# Altium footprint library Pcb-hionyPcbLib.PcbLib: 580 footprints (part 36 of 37)
Each footprint in its own frame and in the unit in brackets; x right, y up, seen from the top. Pads: shape width x height; smd on the part's side, far side on the other; paste and mask are expansions set on the pad; w line width, h text height; cw(c..) or ccw(c..) is an arc to the next point about the centre after c.
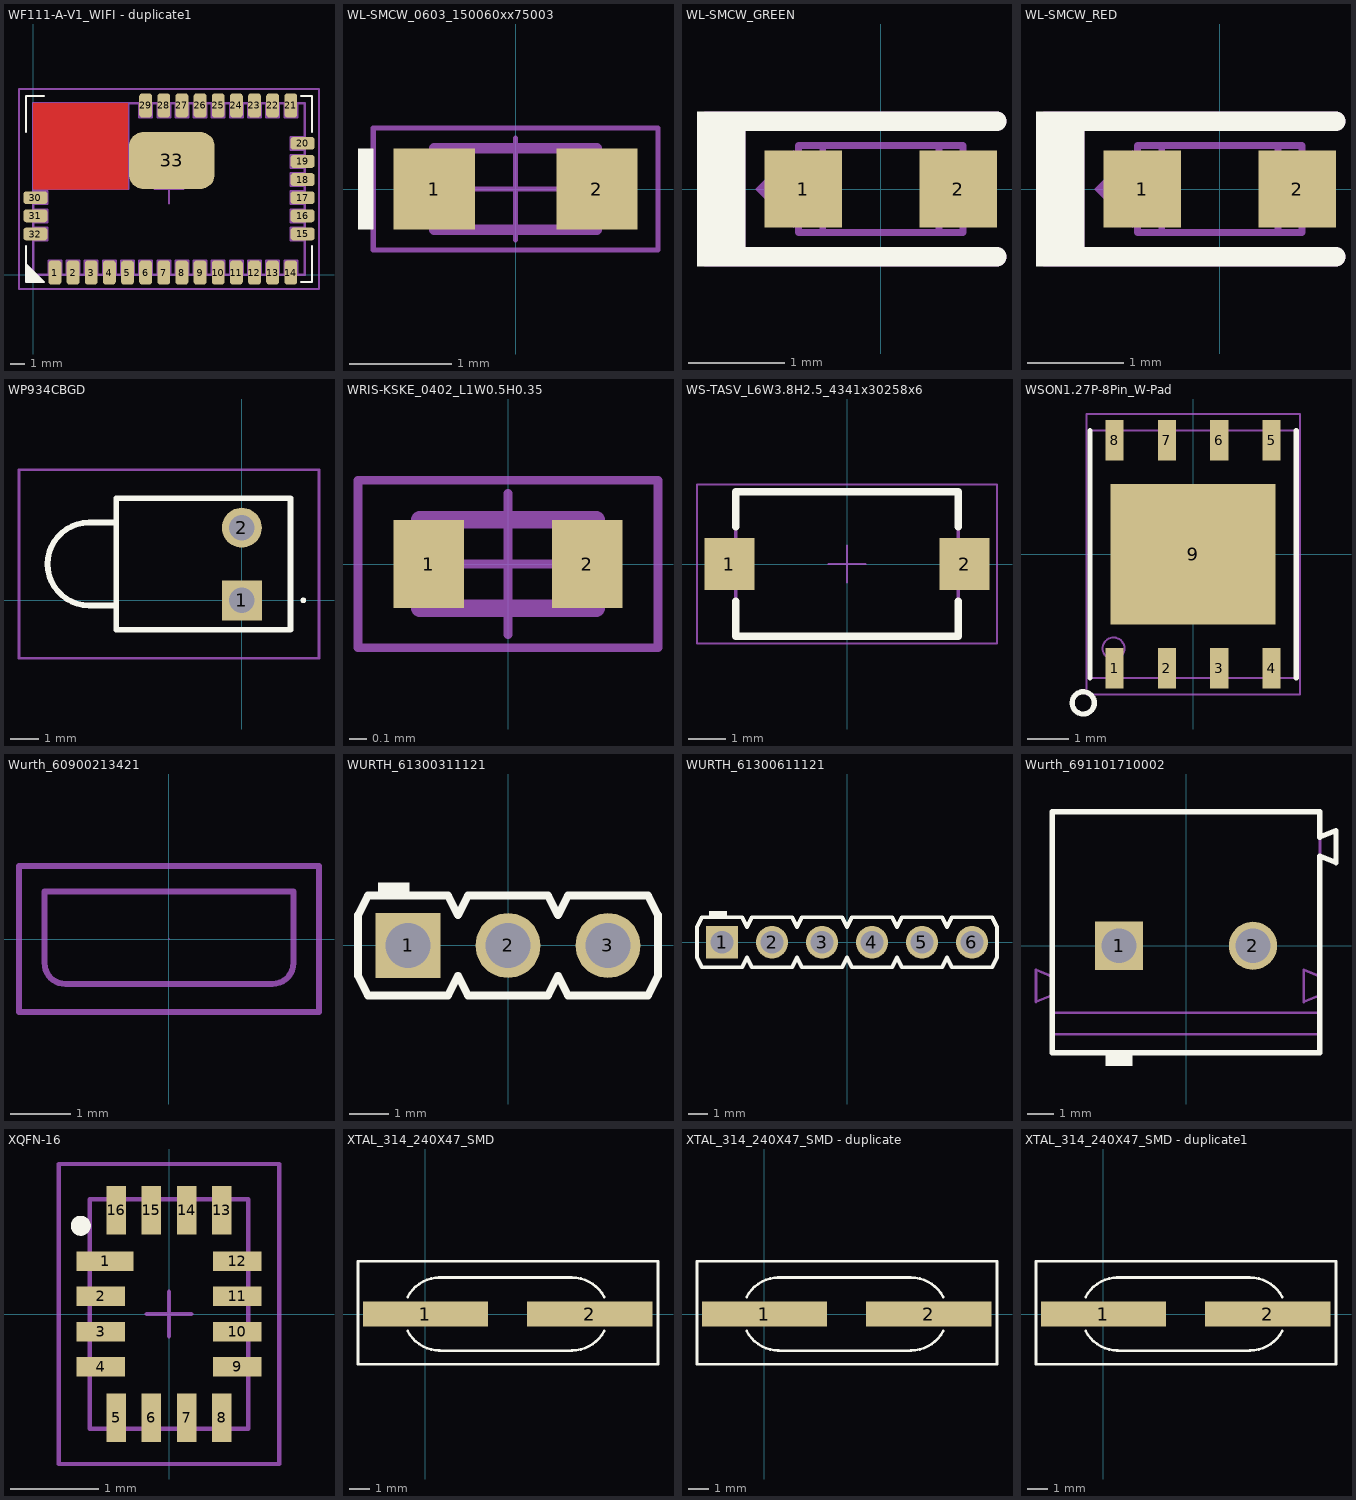
[diagram p35: the footprints below, top view; thin cyan lines are the x and y axes]

## WF111-A-V1_WIFI - duplicate1 [mm]
pads (33):
  rrect50% 0.9x1.7 smd mask+0.05: 1(1.515,0.15) 2(2.785,0.15) 3(4.055,0.15) 4(5.325,0.15) 5(6.595,0.15) 6(7.865,0.15) 7(9.135,0.15) 8(10.405,0.15) 9(11.675,0.15) 10(12.945,0.15) 11(14.215,0.15) 12(15.485,0.15) 13(16.755,0.15) 14(18.025,0.15) 21(18.025,11.85) 22(16.755,11.85) 23(15.485,11.85) 24(14.215,11.85) 25(12.945,11.85) 26(11.675,11.85) 27(10.405,11.85) 28(9.135,11.85) 29(7.865,11.85)
  rrect50% 1.7x0.9 smd mask+0.05: 15(18.85,2.85) 16(18.85,4.12) 17(18.85,5.39) 18(18.85,6.66) 19(18.85,7.93) 20(18.85,9.2) 30(0.15,5.39) 31(0.15,4.12) 32(0.15,2.85)
  rrect50% 6x4 smd mask+0.05: 33(9.7,8)
Top Layer:
  pour cut-out: 0,6 0,12 6.6,12 6.6,6
Top Overlay:
  region: 0.8,-0.5 -0.5,0.8 -0.5,-0.5
  lines w0.15: -0.5,2 -0.5,-0.5 0.75,-0.5 ; -0.5,10 -0.5,12.5 0.75,12.5 ; 18.75,-0.5 19.5,-0.5 19.5,2 ; 18.75,12.5 19.5,12.5 19.5,10
Mechanical 13:
  lines w0.15: 0,6 6.665,6 ; 0,6.6 5.4,12 ; 0,7.9 4.1,12 ; 0,9.2 2.8,12 ; 0,10.5 1.5,12 ; 0.7,6 6.7,12 ; 2,6 6.65,10.65 ; 3.3,6 6.65,9.35 ; 4.6,6 6.65,8.05 ; 5.9,6 6.633,6.732 ; 6.665,6.085 6.665,12 ; 0,0 19,0 19,12 0,12 0,0 ; 0,2.4 1,2.4 1,3.3 0,3.3 0,2.4 ; 0,3.67 0,4.57 1,4.57 1,3.67 0,3.67 ; 0,4.94 0,5.84 1,5.84 1,4.94 0,4.94 ; 1.065,0 1.065,1 1.965,1 1.965,0 1.065,0 ; 2.335,0 2.335,1 3.235,1 3.235,0 2.335,0 ; 3.605,0 4.505,0 4.505,1 3.605,1 3.605,0 ; 4.875,0 5.775,0 5.775,1 4.875,1 4.875,0 ; 6.145,0 7.045,0 7.045,1 6.145,1 6.145,0 ; 7.415,0 8.315,0 8.315,1 7.415,1 7.415,0 ; 7.415,11 7.415,12 8.315,12 8.315,11 7.415,11 ; 8.685,0 9.585,0 9.585,1 8.685,1 8.685,0 ; 8.685,11 8.685,12 9.585,12 9.585,11 8.685,11 ; 9.955,0 10.855,0 10.855,1 9.955,1 9.955,0 ; 9.955,11 9.955,12 10.855,12 10.855,11 9.955,11 ; 11.225,0 11.225,1 12.125,1 12.125,0 11.225,0 ; 11.225,11 12.125,11 12.125,12 11.225,12 11.225,11 ; 12.495,0 12.495,1 13.395,1 13.395,0 12.495,0 ; 12.495,11 13.395,11 13.395,12 12.495,12 12.495,11 ; 13.765,0 13.765,1 14.665,1 14.665,0 13.765,0 ; 13.765,11 14.665,11 14.665,12 13.765,12 13.765,11 ; 15.035,0 15.035,1 15.935,1 15.935,0 15.035,0 ; 15.035,11 15.935,11 15.935,12 15.035,12 15.035,11 ; 16.305,0 16.305,1 17.205,1 17.205,0 16.305,0 ; 16.305,11 17.205,11 17.205,12 16.305,12 16.305,11 ; 17.575,0 18.475,0 18.475,1 17.575,1 17.575,0 ; 17.575,11 17.575,12 18.475,12 18.475,11 17.575,11 ; 18,2.4 19,2.4 19,3.3 18,3.3 18,2.4 ; 18,3.67 18,4.57 19,4.57 19,3.67 18,3.67 ; 18,4.94 18,5.84 19,5.84 19,4.94 18,4.94 ; 18,6.21 18,7.11 19,7.11 19,6.21 18,6.21 ; 18,7.48 18,8.38 19,8.38 19,7.48 18,7.48 ; 18,8.75 18,9.65 19,9.65 19,8.75 18,8.75
  text "NO GND" at 2.1,8.5 h0.55
Mechanical 15:
  lines w0.15: 8.5,6 9.5,6 ; 9.5,5 9.5,6 ; 9.5,7 9.5,6 ; 10.5,6 9.5,6 ; -1,-1 -1,13 20,13 20,-1 -1,-1
  text "29" at 8.35,12.215 h0.55
  text "21" at 18.55,12.19 h0.55
  text ".Designator" at 10.425,4.965 h0.55
  text "1" at 1.7,0.54 h0.55
  text "14" at 18.525,0.54 h0.55
3D body: height 0.8, standoff 0, extent 0,0 19,12
3D body: height 2, standoff 0.8, extent 6.75,1.25 19,10.75
3D body: height 2, standoff 0.8, extent 0.225,9.725 1.225,11.725

## WL-SMCW_0603_150060xx75003 [mm] "SMD Mono-color Chip LED, body 1.6x0.8mm"
height 0.7
pads (2):
  rect 0.8x0.8 smd: 1(-0.8,0) 2(0.8,0)
Top Overlay:
  rectangle: -1.55,-0.4 -1.4,0.4
Top Component Outline:
  rectangle: -0.8,-0.4 -0.5,0.4
  lines w0.1: -0.8,-0.4 0.8,-0.4 0.8,0.4 -0.8,0.4 -0.8,-0.4
Top Courtyard:
  lines w0.05: -0.5,0 0.5,0 ; 0,-0.5 0,0.5 ; -1.4,-0.6 1.4,-0.6 1.4,0.6 -1.4,0.6 -1.4,-0.6
Top Designator:
  text ".Designator" at -2.499,-0.167 h0.5
3D body "150060xxx.stp": height 0.7, standoff 0, extent -0.8,-0.4 0.8,0.4

## WL-SMCW_GREEN [mm]
pads (2):
  rect 0.8x0.8 smd: 1(-0.8,0) 2(0.8,0)
Top Overlay:
  rectangle: -1.9,-0.8 -1.4,0.8
  lines w0.2: -1.6,-0.7 1.2,-0.7 ; -1.6,0.7 1.2,0.7
Top 3D Body:
  region: -0.9,-0.4 -0.9,0.4 -1.3,0
  lines w0.2: -1.65,-0.7 -1.65,0.55 ; 1.2,-0.7 -1.5,-0.7 ; 1.2,0.7 -1.5,0.7 ; -1.5,-0.7 -1.5,0.7 ; -1.5,-0.7 -1.8,-0.7 -1.8,0.7 -1.5,0.7
  text ".Designator" at -0.8,-0.3 h0.45
Mechanical 13:
  lines w0.07: -0.6,-0.45 -0.6,0.45 ; 0.6,-0.45 0.6,0.45 ; -0.85,-0.45 -0.85,0.45 0.85,0.45 0.85,-0.45 -0.85,-0.45
3D body: height 0.35, standoff 0, extent -0.849,-0.449 -0.601,0.449
3D body: height 0.35, standoff 0, extent -0.599,-0.449 0.599,0.449
3D body: height 0.35, standoff 0, extent 0.601,-0.449 0.849,0.449
3D body: height 0.8, standoff 0.35, extent -0.599,-0.449 0.599,0.449

## WL-SMCW_RED [mm]
pads (2):
  rect 0.8x0.8 smd: 1(-0.8,0) 2(0.8,0)
Top Overlay:
  rectangle: -1.9,-0.8 -1.4,0.8
  lines w0.2: -1.6,-0.7 1.2,-0.7 ; -1.6,0.7 1.2,0.7
Top 3D Body:
  region: -0.9,-0.4 -0.9,0.4 -1.3,0
  lines w0.2: -1.65,-0.7 -1.65,0.55 ; 1.2,-0.7 -1.5,-0.7 ; 1.2,0.7 -1.5,0.7 ; -1.5,-0.7 -1.5,0.7 ; -1.5,-0.7 -1.8,-0.7 -1.8,0.7 -1.5,0.7
  text ".Designator" at -0.8,-0.3 h0.45
Mechanical 13:
  lines w0.07: -0.6,-0.45 -0.6,0.45 ; 0.6,-0.45 0.6,0.45 ; -0.85,-0.45 -0.85,0.45 0.85,0.45 0.85,-0.45 -0.85,-0.45
3D body: height 0.35, standoff 0, extent -0.849,-0.449 -0.601,0.449
3D body: height 0.35, standoff 0, extent -0.599,-0.449 0.599,0.449
3D body: height 0.35, standoff 0, extent 0.601,-0.449 0.849,0.449
3D body: height 0.8, standoff 0.35, extent -0.599,-0.449 0.599,0.449

## WP934CBGD [mm]
pads (2):
  rect 1.4x1.4 hole 0.9: 1(0,0)
  round 1.4 hole 0.9: 2(0,2.54)
Top Overlay:
  lines w0.1: 2.1,0 ccw(c2.15,0) 2.2,0 ccw(c2.15,0) 2.1,0
  lines w0.2: -4.4,-0.18 -5.35,-0.18 cw(c-5.35,1.27) -5.35,2.72 -4.4,2.72 ; -4.4,-1.03 -4.4,3.57 1.7,3.57 1.7,-1.03 -4.4,-1.03
Mechanical 15:
  lines w0.1: -4.4,-0.18 -5.35,-0.18 cw(c-5.35,1.27) -5.35,2.72 -4.4,2.72 ; -4.4,-1.03 -4.4,3.57 1.7,3.57 1.7,-1.03 -4.4,-1.03
Mechanical 20:
  lines w0.1: -7.8,-2.03 -7.8,4.57 2.7,4.57 2.7,-2.03 -7.8,-2.03
3D body "zzz34CB.STEP": height 7.46, standoff -3.34, extent -7.042,-1.27 1.708,3.33

## WRIS-KSKE_0402_L1W0.5H0.35 [mm] "Thick Film Resistors, SMT, body size 1x0.5mm"
height 0.35
pads (2):
  rect 0.4x0.5 smd: 1(-0.45,0) 2(0.45,0)
Top Component Outline:
  lines w0.1: -0.5,-0.25 -0.5,0.25 0.5,0.25 0.5,-0.25 -0.5,-0.25
Top Courtyard:
  lines w0.05: -0.4,0 0.4,0 ; 0,-0.4 0,0.4 ; -0.85,-0.475 -0.85,0.475 0.85,0.475 0.85,-0.475 -0.85,-0.475
Top Designator:
  text ".Designator" at -2.499,-0.167 h0.5
3D body "WRIS-KSKE_0402.stp": height 0.35, standoff 0, extent -0.5,-0.25 0.5,0.25

## WS-TASV_L6W3.8H2.5_4341x30258x6 [mm] "SMD Tact Switch, body 6x3.8mm"
height 2.5
pads (2):
  rect 1.35x1.4 smd: 1(-3.175,0) 2(3.175,0)
Top Overlay:
  lines w0.2: -3,-1 -3,-1.95 3,-1.95 3,-1 ; -3,1 -3,1.95 3,1.95 3,1
Top Component Outline:
  lines w0.1: -3,-1.95 -3,1.95 3,1.95 3,-1.95 -3,-1.95
Top Courtyard:
  lines w0.05: -0.5,0 0.5,0 ; 0,-0.5 0,0.5 ; -4.05,-2.15 -4.05,2.15 4.05,2.15 4.05,-2.15 -4.05,-2.15
Top 3D Body:
  lines w0.1: -3,-1.95 3,-1.95 3,1.95 -3,1.95 -3,-1.95
Top Designator:
  text ".Designator" at -4.998,-0.333 h1
3D body "4341x30258xx.stp": height 2.5, standoff 0, extent -3.5,-1.95 3.5,1.95

## WSON1.27P-8Pin_W-Pad [mm]
pads (9):
  rect 0.44x0.98 smd: 1(-1.905,-2.765) 2(-0.635,-2.765) 3(0.635,-2.765) 4(1.905,-2.765) 5(1.905,2.765) 6(0.635,2.765) 7(-0.635,2.765) 8(-1.905,2.765)
  rect 4x3.4 smd paste-4 mask+0: 9(0,0)
Top Overlay:
  circle w0.127: c-2.667,-3.607 r0.27
  lines w0.127: -2.5,-3 -2.5,3 ; 2.5,-3 2.5,3
Top Paste:
  region: 1.64,-1.34 0.18,-1.34 0.18,-0.18 1.64,-0.18
  region: 1.64,0.18 0.18,0.18 0.18,1.34 1.64,1.34
  region: -0.18,-1.34 -1.64,-1.34 -1.64,-0.18 -0.18,-0.18
  region: -0.18,0.18 -1.64,0.18 -1.64,1.34 -0.18,1.34
Mechanical 11:
  text ".Designator" at -0.838,-0.229 h0.5
Mechanical 13:
  circle w0.05: c-1.93,-2.286 r0.265
  lines w0.05: -2.5,-3 -2.5,3 2.5,3 2.5,-3 -2.5,-3
Mechanical 15:
  lines w0.05: -0.35,0 0.35,0 ; 0,-0.35 0,0.35 ; -2.591,-3.404 -2.591,3.404 2.591,3.404 2.591,-3.404 -2.591,-3.404
3D body "SON9P127_500X600X80L62X41T400X340.STEP": height 0.8, standoff 0, extent -2.5,-3.05 2.5,3.05

## Wurth_60900213421 [mil]
pads (1):
  round 1 on Mech3: 0(0,0)
Top 3D Body:
  lines w3.94: -98.42,-48.03 -98.42,48.03 98.43,48.03 98.43,-48.03 -98.42,-48.03 ; -81.69,-15.71 ccw(c-67.89,-15.73) -67.91,-29.53 67.92,-29.53 ccw(c67.9,-15.73) 81.7,-15.71 81.7,31.3 -81.69,31.3 -81.69,-15.71
  text ".Designator" at -58.07,-11.81 h31.5
3D body "60900213421.stp": height 235.91, standoff 0.48, extent -98.42,-48.03 98.43,48.04

## WURTH_61300311121 [mm]
pads (3):
  rect 1.65x1.65 hole 1.15: 1(-2.54,0)
  round 1.65 hole 1.15: 2(0,0) 3(2.54,0)
Top Overlay:
  rectangle: -3.3,1.3 -2.5,1.6
  lines w0.2: -3.81,-0.77 -3.56,-1.27 -1.52,-1.27 -1.27,-0.77 -1.02,-1.27 1.02,-1.27 1.27,-0.77 1.52,-1.27 3.56,-1.27 3.81,-0.77 3.81,0.77 3.56,1.27 1.52,1.27 1.27,0.77 1.02,1.27 -1.02,1.27 -1.27,0.77 -1.52,1.27 -3.56,1.27 -3.81,0.77 -3.81,-0.77
Top 3D Body:
  lines w0.1: -3.81,-0.77 -3.81,0.77 -3.56,1.27 -1.52,1.27 -1.27,0.77 -1.02,1.27 1.02,1.27 1.27,0.77 1.52,1.27 3.56,1.27 3.81,0.77 3.81,-0.77 3.56,-1.27 1.52,-1.27 1.27,-0.77 1.02,-1.27 -1.02,-1.27 -1.27,-0.77 -1.52,-1.27 -3.56,-1.27 -3.81,-0.77
  text ".Designator" at -1.524,-0.508 h1.02
3D body "61300311121.stp": height 8.54, standoff -3, extent -3.81,-1.27 3.81,1.27

## WURTH_61300611121 [mm]
pads (6):
  rect 1.65x1.65 hole 1.15: 1(-6.35,0)
  round 1.65 hole 1.15: 2(-3.81,0) 3(-1.27,0) 4(1.27,0) 5(3.81,0) 6(6.35,0)
Top Overlay:
  rectangle: -7,1.27 -6.1,1.6
  lines w0.2: -7.62,-0.77 -7.62,0.77 -7.37,1.27 -5.33,1.27 -5.08,0.77 -4.83,1.27 -2.79,1.27 -2.54,0.77 -2.29,1.27 -0.25,1.27 0,0.77 0.25,1.27 2.29,1.27 2.54,0.77 2.79,1.27 4.83,1.27 5.08,0.77 5.33,1.27 7.37,1.27 7.62,0.77 7.62,-0.77 7.37,-1.27 5.33,-1.27 5.08,-0.77 4.83,-1.27 2.79,-1.27 2.54,-0.77 2.29,-1.27 0.25,-1.27 0,-0.77 -0.25,-1.27 -2.29,-1.27 -2.54,-0.77 -2.79,-1.27 -4.83,-1.27 -5.08,-0.77 -5.33,-1.27 -7.37,-1.27 -7.62,-0.77
Top 3D Body:
  lines w0.1: -7.62,-0.77 -7.37,-1.27 -5.33,-1.27 -5.08,-0.77 -4.83,-1.27 -2.79,-1.27 -2.54,-0.77 -2.29,-1.27 -0.25,-1.27 0,-0.77 0.25,-1.27 2.29,-1.27 2.54,-0.77 2.79,-1.27 4.83,-1.27 5.08,-0.77 5.33,-1.27 7.37,-1.27 7.62,-0.77 7.62,0.77 7.37,1.27 5.33,1.27 5.08,0.77 4.83,1.27 2.79,1.27 2.54,0.77 2.29,1.27 0.25,1.27 0,0.77 -0.25,1.27 -2.29,1.27 -2.54,0.77 -2.79,1.27 -4.83,1.27 -5.08,0.77 -5.33,1.27 -7.37,1.27 -7.62,0.77 -7.62,-0.77
  text ".Designator" at -1.524,-0.508 h1.02
3D body "61300611121.stp": height 8.54, standoff -3, extent -7.62,-1.27 7.62,1.27

## Wurth_691101710002 [mm]
pads (2):
  rect 1.8x1.8 hole 1.3: 1(-2.5,0)
  round 1.8 hole 1.3: 2(2.5,0)
Top Overlay:
  rectangle: -3,-4.5 -2,-4
  lines w0.2: -5,-4 5,-4 5,3.35 5.6,3.1 5.6,4.3 5,4.05 5,5 -5,5 -5,-4
Top 3D Body:
  lines w0.1: -5,-3.3 5,-3.3 ; -5,-2.5 5,-2.5 ; -5,-1.85 -5.6,-2.1 -5.6,-0.9 -5,-1.15 ; 5,-1.85 4.4,-2.1 4.4,-0.9 5,-1.15 ; 5,3.35 5.6,3.1 5.6,4.3 5,4.05 ; -5,-4 -5,5 5,5 5,-4 -5,-4
  text ".Designator" at -1.625,-0.4 h1.02
3D body "691101710002.stp": height 12.5, standoff -3.9, extent -5.6,-4 5.6,5

## XQFN-16 [mm]
pads (16):
  rect 0.65x0.22 smd mask+0.05: 1(-0.725,0.6)
  rect 0.55x0.22 smd mask+0.05: 2(-0.775,0.2) 3(-0.775,-0.2) 4(-0.775,-0.6) 9(0.775,-0.6) 10(0.775,-0.2) 11(0.775,0.2) 12(0.775,0.6)
  rect 0.22x0.55 smd mask+0.05: 5(-0.6,-1.175) 6(-0.2,-1.175) 7(0.2,-1.175) 8(0.6,-1.175) 13(0.6,1.175) 14(0.2,1.175) 15(-0.2,1.175) 16(-0.6,1.175)
Top Overlay:
  circle w0.127: c-1,1 r0.05
Mechanical 11:
  text ".Designator" at -0.635,0 h0.5
Mechanical 13:
  circle w0.05: c-0.71,0.6 r0.01
  lines w0.05: -0.9,-1.3 0.9,-1.3 0.9,1.3 -0.9,1.3 -0.9,-1.3
Mechanical 15:
  lines w0.05: -0.25,0 0.25,0 ; 0,-0.25 0,0.25 ; 0,-0.1 0,0.1 ; -1.25,-1.7 1.25,-1.7 1.25,1.7 -1.25,1.7 -1.25,-1.7
3D body "User Library-XQFN-16-1.step": height 0.56, standoff 0.01, extent -0.91,-1.31 0.91,1.31

## XTAL_314_240X47_SMD [mm]
pads (2):
  rect 6.096x1.2 smd: 1(0,0) 2(8,0)
Top Overlay:
  lines w0.127: -0.873,-0.825 ccw(c0.702,0) 0.702,-1.778 ; -0.873,0.825 cw(c0.702,0) 0.702,1.778 ; 0.651,-1.787 7.137,-1.787 ; 0.651,1.778 7.128,1.778 cw(c7.128,0) 8.703,0.825 ; 7.128,-1.778 ccw(c7.128,0) 8.703,-0.825 ; -3.286,-2.438 -3.286,2.565 11.319,2.565 11.319,-2.438 -3.286,-2.438
3D body: height 3.05, standoff 0, extent -1.076,-1.778 8.881,1.778
3D body: height 0.51, standoff 0, extent -1.902,-2.273 9.795,2.413
3D body: height 1.02, standoff 0, extent 7.992,1.143 9.795,2.413
3D body: height 1.02, standoff 0, extent -1.889,1.143 -0.086,2.413
3D body: height 1.02, standoff 0, extent -1.902,-2.273 -0.098,-1.003
3D body: height 1.02, standoff 0, extent 8.004,-2.273 9.808,-1.003
3D body: height 0.25, standoff 0, extent -2.994,-0.419 -1.673,0.394
3D body: height 0.25, standoff 0, extent 9.579,-0.419 10.9,0.394

## XTAL_314_240X47_SMD - duplicate [mm]
pads (2):
  rect 6.096x1.2 smd: 1(0,0) 2(8,0)
Top Overlay:
  lines w0.127: -0.873,-0.825 ccw(c0.702,0) 0.702,-1.778 ; -0.873,0.825 cw(c0.702,0) 0.702,1.778 ; 0.651,-1.787 7.137,-1.787 ; 0.651,1.778 7.128,1.778 cw(c7.128,0) 8.703,0.825 ; 7.128,-1.778 ccw(c7.128,0) 8.703,-0.825 ; -3.286,-2.438 11.319,-2.438 11.319,2.565 -3.286,2.565 -3.286,-2.438
3D body: height 0.25, standoff 0, extent 9.579,-0.419 10.9,0.394
3D body: height 0.25, standoff 0, extent -2.994,-0.419 -1.673,0.394
3D body: height 1.02, standoff 0, extent 8.004,-2.273 9.808,-1.003
3D body: height 1.02, standoff 0, extent -1.902,-2.273 -0.098,-1.003
3D body: height 1.02, standoff 0, extent -1.889,1.143 -0.086,2.413
3D body: height 1.02, standoff 0, extent 7.992,1.143 9.795,2.413
3D body: height 0.51, standoff 0, extent -1.902,-2.273 9.795,2.413
3D body: height 3.05, standoff 0, extent -1.076,-1.778 8.881,1.778

## XTAL_314_240X47_SMD - duplicate1 [mm] "CASE: TH"
height 3
pads (2):
  rect 6.096x1.2 smd: 1(0,0) 2(8,0)
Top Overlay:
  lines w0.127: -0.873,-0.825 ccw(c0.702,0) 0.702,-1.778 ; -0.873,0.825 cw(c0.702,0) 0.702,1.778 ; 0.651,-1.787 7.137,-1.787 ; 0.651,1.778 7.128,1.778 cw(c7.128,0) 8.703,0.825 ; 7.128,-1.778 ccw(c7.128,0) 8.703,-0.825 ; -3.286,-2.438 11.319,-2.438 11.319,2.565 -3.286,2.565 -3.286,-2.438
3D body: height 0.25, standoff 0, extent -2.994,-0.419 -1.673,0.394
3D body: height 0.25, standoff 0, extent 9.579,-0.419 10.9,0.394
3D body: height 1.02, standoff 0, extent -1.889,1.143 -0.086,2.413
3D body: height 1.02, standoff 0, extent 7.992,1.143 9.795,2.413
3D body: height 1.02, standoff 0, extent -1.902,-2.273 -0.098,-1.003
3D body: height 1.02, standoff 0, extent 8.004,-2.273 9.808,-1.003
3D body: height 3.05, standoff 0, extent -1.076,-1.778 8.881,1.778
3D body: height 0.51, standoff 0, extent -1.902,-2.273 9.795,2.413